# Altium footprint library THT.PcbLib: 60 footprints (part 2 of 4)
Each footprint in its own frame and in the unit in brackets; x right, y up, seen from the top. Pads: shape width x height; smd on the part's side, far side on the other; paste and mask are expansions set on the pad; w line width, h text height; cw(c..) or ccw(c..) is an arc to the next point about the centre after c.
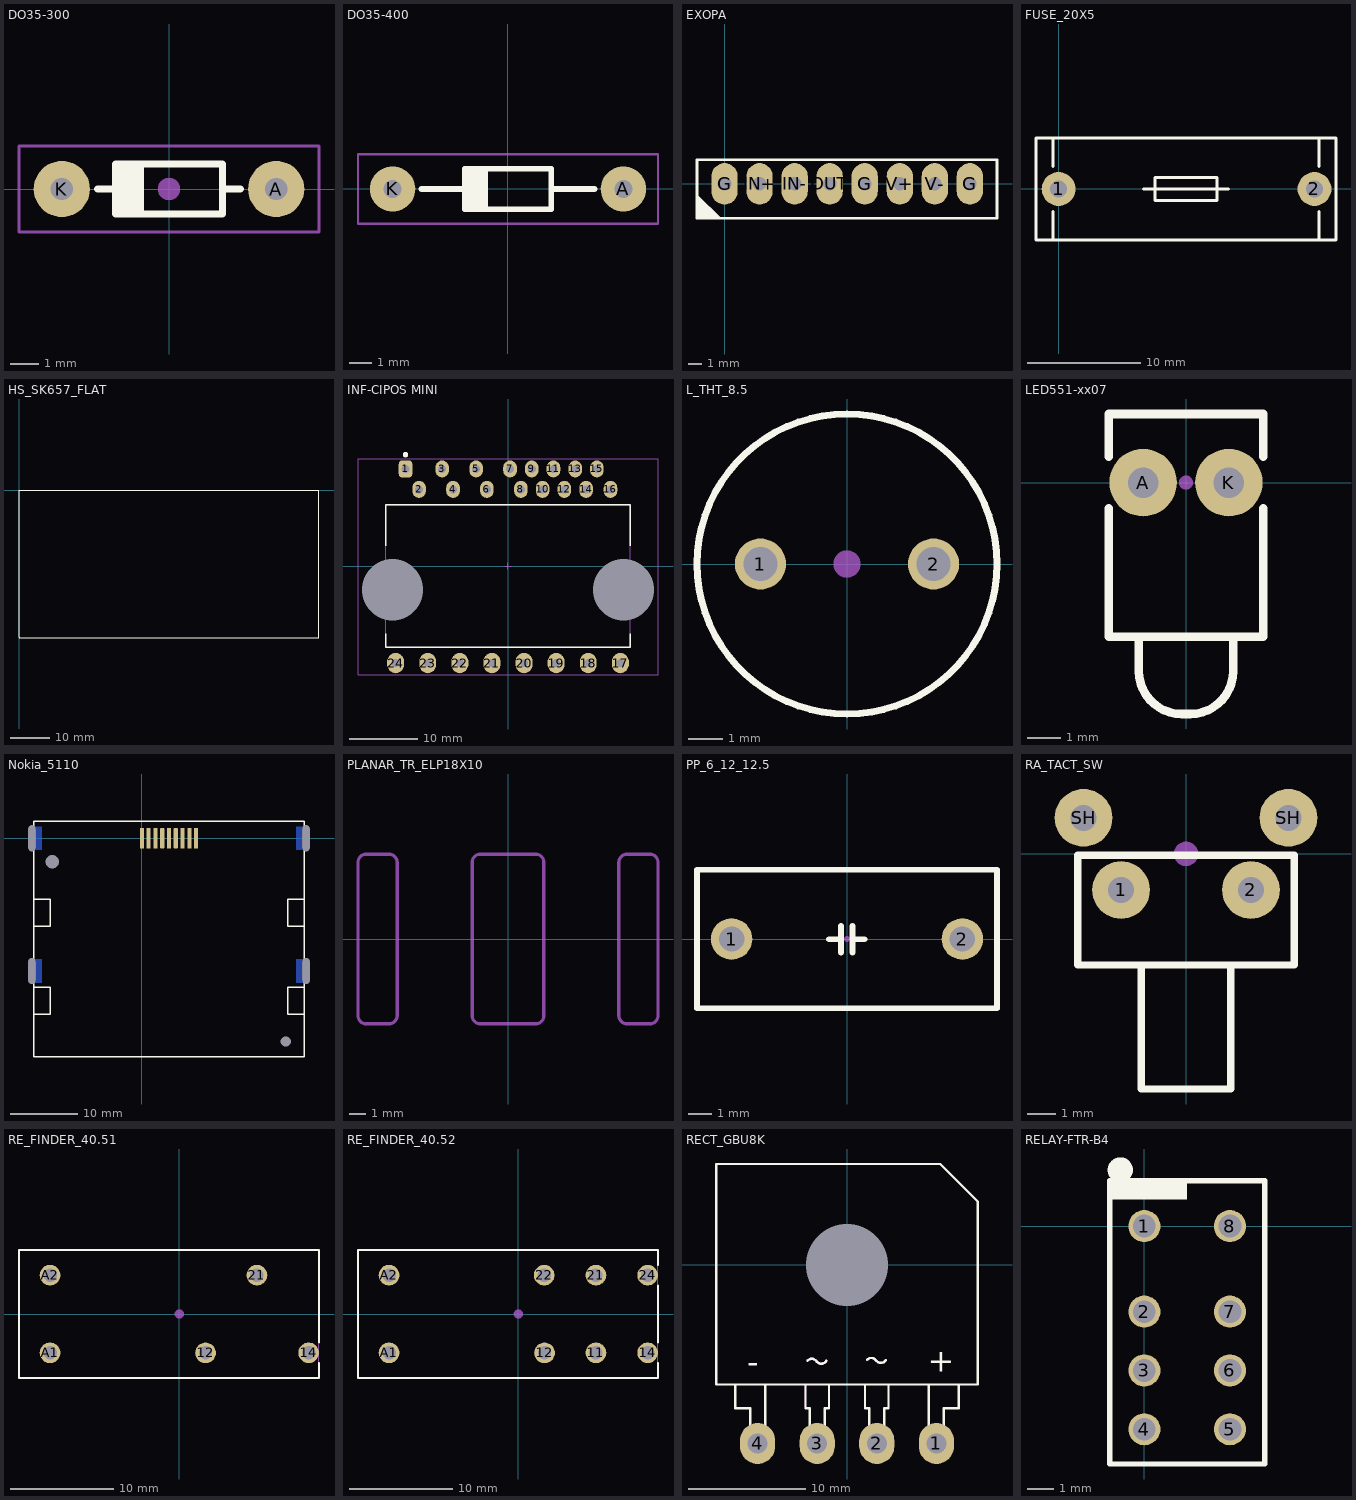
[diagram p1: the footprints below, top view; thin cyan lines are the x and y axes]

## DO35-300 [mm]
pads (2):
  round 2 hole 0.8: A(3.81,0) K(-3.81,0)
Top Overlay:
  rectangle: -1.905,-0.889 -0.889,0.889
  lines w0.254: -2.54,0 -1.905,0 ; 1.905,0 2.54,0 ; -1.905,-0.889 -1.905,0.889 1.905,0.889 1.905,-0.889 -1.905,-0.889
Mechanical 15:
  circle w0.4: c0,0 r0.199
  lines w0.1: -5.334,-1.524 5.334,-1.524 5.334,1.524 -5.334,1.524 -5.334,-1.524
3D body "User Library-DO-35G-30.step": height 1.92, standoff -1.9, extent -4.085,-0.894 4.085,0.894

## DO35-400 [mm]
pads (2):
  round 2 hole 0.8: A(5.08,0) K(-5.08,0)
Top Overlay:
  rectangle: -1.905,-0.889 -0.889,0.889
  lines w0.254: -3.81,0 -1.905,0 ; 1.905,0 3.81,0 ; -1.905,-0.889 -1.905,0.889 1.905,0.889 1.905,-0.889 -1.905,-0.889
Mechanical 15:
  lines w0.1: -6.604,-1.524 -6.604,1.524 6.604,1.524 6.604,-1.524 -5.334,-1.524 -6.604,-1.524
3D body "User Library-DO-35G-40.step": height 1.92, standoff -1.9, extent -5.355,-0.894 5.355,0.894

## EXOPA [mm]
pads (8):
  oval 1.9x3 hole 1: G(0,0) G(10.16,0) G(17.78,0) IN+(2.54,0) IN-(5.08,0) OUT(7.62,0) V+(12.7,0) V-(15.24,0)
Top Overlay:
  region: -2,-0.75 -0.25,-2.5 -2,-2.5
  lines w0.2: -2,-2.5 -2,1.75 19.75,1.75 19.75,-2.5 -2,-2.5
3D body "external_opa.STEP": height 23.6, standoff -8.15, extent -1.8,-2.5 19.6,1.362

## FUSE_20X5 [mm]
height 5.9
pads (2):
  round 3 / inner round 3 / far side oval 3x4 hole 1.5: 1(0,0) 2(22.6,0)
Top Overlay:
  lines w0.254: -0.5,-4.5 -0.5,-2 ; -0.5,2 -0.5,4.5 ; 7.5,0 15,0 ; 23,-4.5 23,-2 ; 23,2 23,4.5 ; -2,-4.5 -2,0 -2,4.5 24.5,4.5 24.5,-4.5 -2,-4.5 ; 8.5,-1 14,-1 14,1 8.5,1 8.5,-1
3D body "User Library-Fuse_Holder.STEP": height 13.34, standoff -5.5, extent -0.24,-4.5 22.92,4.5

## HS_SK657_FLAT [mm]
Top Overlay:
  lines w0.2: 0,-36.8 0,0 75.1,0 75.1,-36.9 0.1,-36.9 0,-36.8
3D body "SK 657.STEP": height 25, standoff 0, extent 0.1,-36.9 75.1,-0.1

## INF-CIPOS MINI [mm] "CIPOS MINI;24 pin, 21mm W X 36mm L X 5.6mm H body"
height 5.6
pads (26):
  rrect50% 2x2.5 hole 1.2 paste-2539.97 mask+0: 1(-15.1,14.3)
  oval 2x2.5 hole 1.2 paste-2539.97 mask+0: 2(-13.1,11.3) 3(-9.7,14.3) 4(-8.1,11.3) 5(-4.7,14.3) 6(-3.1,11.3) 7(0.3,14.3) 8(1.9,11.3) 9(3.5,14.3) 10(5.1,11.3) 11(6.7,14.3) 12(8.3,11.3) 13(9.9,14.3) 14(11.5,11.3) 15(13.1,14.3) 16(15.1,11.3)
  oval 2.5x3 hole 1.2 paste-2539.97 mask+0: 17(16.555,-14.3) 18(11.825,-14.3) 19(7.095,-14.3) 20(2.365,-14.3) 21(-2.365,-14.3) 22(-7.095,-14.3) 23(-11.825,-14.3) 24(-16.555,-14.3)
  round 0 hole 9 unplated paste-2539.97 mask+0: ""(-17.025,-3.5) ""(17.025,-3.5)
Top Overlay:
  circle w0.4: c-15.1,16.4 r0.2
  lines w0.2: -18,-10 -18,-12 18,-12 18,-10 ; -18,3 -18,9 18,9 18,3
Mechanical 13:
  lines w0.1: -18,-12 18,-12 18,9 -18,9 -18,-12
Mechanical 15:
  lines w0.1: -0.5,0 0.5,0 ; 0,-0.5 0,0.5 ; -22.1,-16 -22.1,15.8 22.1,15.8 22.1,-16 -22.1,-16
3D body "MDIP-24-X1.stp": height 3.61, standoff -6.25, extent -18,-14.56 18,14.559

## L_THT_8.5 [mm]
pads (2):
  round 1.5 / inner round 1.5 / far side oval 2x2.5 hole 1: 1(-2.54,0) 2(2.54,0)
Top Overlay:
  circle w0.2: c0,0 r4.401
Mechanical 15:
  circle w0.4: c0,0 r0.2
3D body "INDRD_WURTH_WE-TI.stp": height 10, standoff -3.6, extent -4.65,-4.65 4.65,4.65

## LED551-xx07 [mm]
pads (2):
  round 2 hole 0.9: A(-1.27,0) K(1.27,0)
Top Overlay:
  lines w0.254: -2.286,-0.762 -2.286,-4.572 2.286,-4.572 2.286,-0.762 ; -2.286,0.762 -2.286,2.032 2.286,2.032 2.286,0.762 ; -1.397,-4.572 -1.397,-5.588 ccw(c-0.127,-5.588) -0.127,-6.858 0,-6.858 0.127,-6.858 ccw(c0.127,-5.588) 1.397,-5.588 1.397,-4.572
Mechanical 15:
  circle w0.254: c0,0 r0.081
3D body "User Library-Led 3mm Dialight mod 551-1107F.step": height 7.12, standoff -2.48, extent -2.161,-6.985 2.159,1.905

## Nokia_5110 [mm]
pads (15):
  oval 1x3.8 hole 1 slot 3.8 at 90 deg: 0(-16.25,-19.6) 0(-16.25,0) 0(24.25,-19.6) 0(24.25,0)
  round 0 hole 2 unplated: 0(-13.25,-3.5)
  round 0 hole 1.5 unplated: 0(21.25,-30)
  rrect20% 0.6x3 smd: 1(0,0) 2(1,0) 3(2,0) 4(3,0) 5(4,0) 6(5,0) 7(6,0) 8(7,0) 9(8,0)
Bottom Layer:
  region: -14.75,-17.85 -16.25,-17.85 -16.25,-21.35 -14.75,-21.35
  region: -14.75,1.75 -16.25,1.75 -16.25,-1.75 -14.75,-1.75
  rectangle: 22.75,-1.75 24.25,1.75
  rectangle: 22.75,-21.35 24.25,-17.85
Top Overlay:
  lines w0.2: -16,-26 -13.5,-26 -13.5,-22 -16,-22 ; -16,-13 -13.5,-13 -13.5,-9 -16,-9 ; 24,-26 21.5,-26 21.5,-22 24,-22 ; 24,-13 21.5,-13 21.5,-9 24,-9 ; -16,-32.25 -16,2.5 24,2.5 24,-32.25 -16,-32.25
Top Solder:
  rectangle: -0.6,-1.7 8.6,1.7
3D body: height 3.5, standoff 0, extent -16,-32.1 24,2

## PLANAR_TR_ELP18X10 [mm]
Board Cutout:
  lines w0.2: -9.2,-4.7 ccw(c-8.7,-4.7) -8.7,-5.2 -7.3,-5.2 ccw(c-7.3,-4.7) -6.8,-4.7 -6.8,4.7 ccw(c-7.3,4.7) -7.3,5.2 -8.7,5.2 ccw(c-8.7,4.7) -9.2,4.7 -9.2,-4.7 ; -2.2,-4.7 ccw(c-1.7,-4.7) -1.7,-5.2 1.7,-5.2 ccw(c1.7,-4.7) 2.2,-4.7 2.2,4.7 ccw(c1.7,4.7) 1.7,5.2 -1.7,5.2 ccw(c-1.7,4.7) -2.2,4.7 -2.2,-4.7 ; 6.8,-4.7 ccw(c7.3,-4.7) 7.3,-5.2 8.7,-5.2 ccw(c8.7,-4.7) 9.2,-4.7 9.2,4.7 ccw(c8.7,4.7) 8.7,5.2 7.3,5.2 ccw(c7.3,4.7) 6.8,4.7 6.8,-4.7
3D body "I18.STEP": height -1.8, standoff -3.8, extent -9,-5 9,5
3D body "ELP18.STEP": height 2.2, standoff -1.8, extent -9,-5 9,5

## PP_6_12_12.5 [mm]
height 2.38
pads (3):
  round 0.254 on Mech15: 0(0,0)
  round 1.8 / inner round 1.8 / far side round 3 hole 1.1: 1(-5,0) 2(5,0)
Top Overlay:
  lines w0.254: -0.773,-0.013 -0.265,-0.013 ; -0.265,-0.584 -0.265,0.559 ; 0.243,-0.584 0.243,0.559 ; 0.243,-0.013 0.751,-0.013 ; 6.5,-2.3 6.5,3 -6.5,3 -6.5,-3 6.5,-3 6.5,2.3
3D body "User Library-Film Capacitor 13x6x12mm.step": height 12.31, standoff -2.19, extent -6.5,-3 6.5,3

## RA_TACT_SW [mm]
pads (4):
  round 2 hole 0.9: 1(-2.25,-1.25) 2(2.25,-1.25) SH(-3.55,1.25) SH(3.55,1.25)
Top Overlay:
  lines w0.254: -1.55,-3.85 -1.55,-8.15 1.45,-8.15 1.55,-8.15 1.55,-3.85 ; -3.75,-3.85 -3.75,-0.05 3.75,-0.05 3.75,-3.85 -3.75,-3.85
Mechanical 15:
  circle w0.4: c0,0 r0.224
3D body "User Library-SWITCH, TACTILE, RIGHT ANGLE, 12VDC, 50MA, 6_85MM ACTUATOR, WEALTH METAL TC-0244Z.step": height 7.1, standoff -3.9, extent -3.711,-8.099 3.689,2.901

## RE_FINDER_40.51 [mm] "8 Leads, 2 Pole 16A Relay, FINDER 40.52 Serie, Body 29mm x 12.4mm"
height 25
pads (5):
  round 2 / inner round 2 / far side oval 2.5x3.5 hole 1.3: 12(2.53,-3.76) 14(12.5,-3.75) 21(7.5,3.75) A1(-12.5,-3.75) A2(-12.5,3.75)
Top Overlay:
  lines w0.2: 13.5,-4.73 13.5,-6.2 -15.5,-6.2 -15.5,6.2 13.5,6.2 13.5,2.77 13.5,-2.77
Mechanical 14:
  lines w0.1: -15.5,-6.2 13.5,-6.2 13.5,6.2 -15.5,6.2 -15.5,-6.2
Mechanical 15:
  circle w0.5: c0,0 r0.2
3D body "REL_FINDER_40.52.stp": height 25, standoff -5.3, extent -15.5,-6.2 13.5,6.2

## RE_FINDER_40.52 [mm] "8 Leads, 2 Pole 16A Relay, FINDER 40.52 Serie, Body 29mm x 12.4mm"
height 25
pads (8):
  round 2 / inner round 2 / far side oval 2.5x3.5 hole 1.3: 11(7.5,-3.75) 12(2.53,-3.76) 14(12.5,-3.75) 21(7.5,3.75) 22(2.5,3.75) 24(12.5,3.75) A1(-12.5,-3.75) A2(-12.5,3.75)
Top Overlay:
  lines w0.2: 13.5,-4.73 13.5,-6.2 -15.5,-6.2 -15.5,6.2 13.5,6.2 13.5,4.73 ; 13.5,-2.77 13.5,2.77
Mechanical 14:
  lines w0.1: -15.5,-6.2 13.5,-6.2 13.5,6.2 -15.5,6.2 -15.5,-6.2
Mechanical 15:
  circle w0.5: c0,0 r0.2
3D body "REL_FINDER_40.52.stp": height 25, standoff -5.3, extent -15.5,-6.2 13.5,6.2

## RECT_GBU8K [mm]
pads (5):
  oval 3x3.5 hole 1.7: 1(7.62,-15.23) 2(2.54,-15.23) 3(-2.54,-15.23) 4(-7.62,-15.23)
  round 0 hole 7 unplated: MECH1(0,0)
Top Overlay:
  lines w0.2: -9.525,-10.2 -9.525,-12.23 -8.255,-12.23 -8.255,-13.73 ; -6.985,-13.73 -6.985,-10.2 ; -3.54,-10.2 -3.54,-12.23 -3.175,-12.23 -3.175,-13.73 ; -3.37,-8.162 cw(c-3.01,-8.509) -2.595,-8.23 ; -2.57,-8.25 ccw(c-2.189,-7.926) -1.76,-8.184 ; -1.905,-13.73 -1.905,-12.23 -1.54,-12.23 -1.54,-10.2 ; 1.54,-10.2 1.54,-12.23 1.905,-12.23 1.905,-13.73 ; 1.71,-8.094 cw(c2.07,-8.44) 2.485,-8.162 ; 2.51,-8.182 ccw(c2.891,-7.858) 3.32,-8.115 ; 3.175,-13.73 3.175,-12.23 3.54,-12.23 3.54,-10.2 ; 6.985,-13.73 6.985,-10.2 ; 8.255,-13.73 8.255,-12.23 9.525,-12.23 9.525,-10.2 ; -11.15,-10.2 -11.15,8.6 7.95,8.6 11.15,5.4 11.15,-10.2 -11.15,-10.2
  text "-" at -8.5,-9.23 h2
  text "+" at 6.897,-9.11 h2
Mechanical 8:
  lines w0.1: -8.62,-15.23 -7.62,-15.23 ; -7.62,-16.23 -7.62,-15.23 ; -7.62,-14.23 -7.62,-15.23 ; -6.62,-15.23 -7.62,-15.23 ; -3.54,-15.23 -2.54,-15.23 ; -2.54,-16.23 -2.54,-15.23 ; -2.54,-14.23 -2.54,-15.23 ; -1.54,-15.23 -2.54,-15.23 ; -1,0 0,0 ; 0,-1 0,0 ; 0,1 0,0 ; 1,0 0,0 ; 1.54,-15.23 2.54,-15.23 ; 2.54,-16.23 2.54,-15.23 ; 2.54,-14.23 2.54,-15.23 ; 3.54,-15.23 2.54,-15.23 ; 6.62,-15.23 7.62,-15.23 ; 7.62,-16.23 7.62,-15.23 ; 7.62,-14.23 7.62,-15.23 ; 8.62,-15.23 7.62,-15.23
Mechanical 14:
  lines w0.1: -9.525,-10.2 -9.525,-12.23 -8.255,-12.23 -8.255,-15.51 -6.985,-15.51 -6.985,-10.2 ; -3.54,-10.2 -3.54,-12.23 -3.175,-12.23 -3.175,-15.51 -1.905,-15.51 -1.905,-12.23 -1.54,-12.23 -1.54,-10.2 ; 1.54,-10.2 1.54,-12.23 1.905,-12.23 1.905,-15.51 3.175,-15.51 3.175,-12.23 3.54,-12.23 3.54,-10.2 ; 6.985,-10.2 6.985,-15.51 8.255,-15.51 8.255,-12.23 9.525,-12.23 9.525,-10.2 ; -11.15,-10.2 -11.15,8.6 7.95,8.6 11.15,5.4 11.15,-10.2 -11.15,-10.2 ; -1.9,-0.95 ccw(c0,-0.95) 1.9,-0.95 1.9,0.95 ccw(c0,0.95) -1.9,0.95 -1.9,-0.95
  lines w0.2: -3.37,-8.162 cw(c-3.01,-8.509) -2.595,-8.23 ; -2.57,-8.25 ccw(c-2.189,-7.926) -1.76,-8.184 ; 1.71,-8.094 cw(c2.07,-8.44) 2.485,-8.162 ; 2.51,-8.182 ccw(c2.891,-7.858) 3.32,-8.115
  text "-" at -8.5,-9.23 h2
  text "+" at 6.897,-9.11 h2
Mechanical 15:
  circle w1: c0,0 r0.18
3D body "FAIRCHILD_GBU-H.stp": height 3.56, standoff -3.6, extent -11.15,-15.51 11.15,8.6

## RELAY-FTR-B4 [mm]
pads (8):
  round 1.2 / inner round 1.2 / far side round 1.8 hole 0.85: 1(0,0) 2(0,-3.2) 3(0,-5.4) 4(0,-7.6) 5(3.2,-7.6) 6(3.2,-5.4) 7(3.2,-3.2) 8(3.2,0)
Top Overlay:
  circle w0.5: c-0.9,2.1 r0.224
  region: 1.586,1.7 1.586,1 -1.386,1 -1.386,1.7
  lines w0.2: -1.3,-8.9 -1.3,1.7 4.5,1.7 4.5,-8.9 -1.3,-8.9
3D body "User Library-FTR-B4C.step": height 9.06, standoff -3.35, extent -1.25,-8.9 4.45,1.7